# Altium footprint library PBL - SMD Packages.PcbLib: 218 footprints (part 14 of 14)
Each footprint in its own frame and in the unit in brackets; x right, y up, seen from the top. Pads: shape width x height; smd on the part's side, far side on the other; paste and mask are expansions set on the pad; w line width, h text height; cw(c..) or ccw(c..) is an arc to the next point about the centre after c.
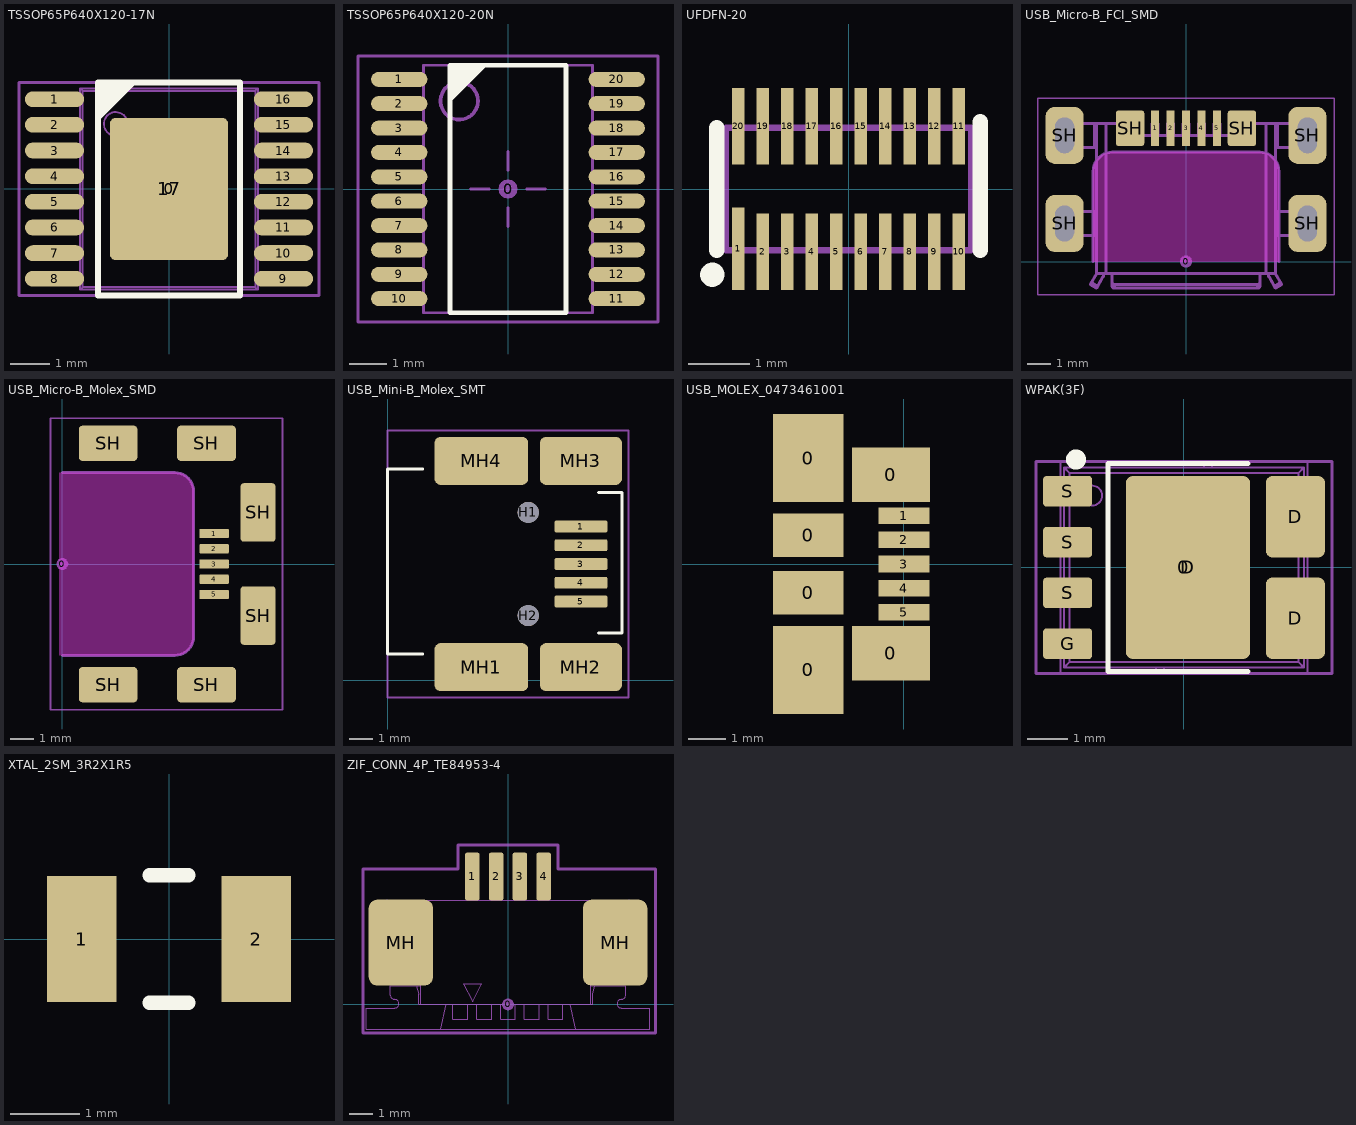
[diagram p13: the footprints below, top view; thin cyan lines are the x and y axes]

## TSSOP65P640X120-17N [mm] "TSSOP, 16 Leads with exposed body pad, Body 5.1x4.5mm (max), Pitch 0.65mm, IPC Medium Density"
height 1.2
pads (18):
  round 0.508 on Mech15: 0(0,0)
  oval 1.5x0.4 smd paste-0.051: 1(-2.9,2.275) 2(-2.9,1.625) 3(-2.9,0.975) 4(-2.9,0.325) 5(-2.9,-0.325) 6(-2.9,-0.975) 7(-2.9,-1.625) 8(-2.9,-2.275) 9(2.9,-2.275) 10(2.9,-1.625) 11(2.9,-0.975) 12(2.9,-0.325) 13(2.9,0.325) 14(2.9,0.975) 15(2.9,1.625) 16(2.9,2.275)
  rrect10% 3x3.6 smd paste-0.051: 17(0,0)
Top Overlay:
  region: -1.8,2.7 -0.8,2.7 -1.8,1.7
  lines w0.152: -1.8,-2.7 1.8,-2.7 1.8,2.7 -1.8,2.7 -1.8,-2.7
  text "." at -2.85,3 h0.1
Top Solder:
  region: 3.5,2.4 2.3,2.4 2.3,-2.4 3.5,-2.4
  rectangle: -3.5,-2.4 -2.3,2.4
13 - 3D Top Side:
  circle w0.05: c-1.35,1.65 r0.3
  lines w0.05: -2.839,-2.425 -2.839,-2.125 ; -2.839,-1.775 -2.839,-1.475 ; -2.839,-1.125 -2.839,-0.825 ; -2.839,-0.475 -2.839,-0.175 ; -2.839,0.175 -2.839,0.475 ; -2.839,0.825 -2.839,1.125 ; -2.839,1.475 -2.839,1.775 ; -2.839,2.125 -2.839,2.425 ; -2.795,-2.425 -2.795,-2.125 ; -2.795,-1.775 -2.795,-1.475 ; -2.795,-1.125 -2.795,-0.825 ; -2.795,-0.475 -2.795,-0.175 ; -2.795,0.175 -2.795,0.475 ; -2.795,0.825 -2.795,1.125 ; -2.795,1.475 -2.795,1.775 ; -2.795,2.125 -2.795,2.425 ; -2.693,-2.425 -2.693,-2.125 ; -2.693,-1.775 -2.693,-1.475 ; -2.693,-1.125 -2.693,-0.825 ; -2.693,-0.475 -2.693,-0.175 ; -2.693,0.175 -2.693,0.475 ; -2.693,0.825 -2.693,1.125 ; -2.693,1.475 -2.693,1.775 ; -2.693,2.125 -2.693,2.425 ; -2.5,-2.425 -2.5,-2.125 ; -2.5,-1.775 -2.5,-1.475 ; -2.5,-1.125 -2.5,-0.825 ; -2.5,-0.475 -2.5,-0.175 ; -2.5,0.175 -2.5,0.475 ; -2.5,0.825 -2.5,1.125 ; -2.5,1.475 -2.5,1.775 ; -2.5,2.125 -2.5,2.425 ; -2.25,-2.425 -3.25,-2.425 -3.25,-2.125 -2.25,-2.125 ; -2.25,-1.775 -3.25,-1.775 -3.25,-1.475 -2.25,-1.475 ; -2.25,-1.125 -3.25,-1.125 -3.25,-0.825 -2.25,-0.825 ; -2.25,-0.475 -3.25,-0.475 -3.25,-0.175 -2.25,-0.175 ; -2.25,0.175 -3.25,0.175 -3.25,0.475 -2.25,0.475 ; -2.25,0.825 -3.25,0.825 -3.25,1.125 -2.25,1.125 ; -2.25,1.475 -3.25,1.475 -3.25,1.775 -2.25,1.775 ; -2.25,2.125 -3.25,2.125 -3.25,2.425 -2.25,2.425 ; 2.25,-2.425 3.25,-2.425 3.25,-2.125 2.25,-2.125 ; 2.25,-1.775 3.25,-1.775 3.25,-1.475 2.25,-1.475 ; 2.25,-1.125 3.25,-1.125 3.25,-0.825 2.25,-0.825 ; 2.25,-0.475 3.25,-0.475 3.25,-0.175 2.25,-0.175 ; 2.25,0.175 3.25,0.175 3.25,0.475 2.25,0.475 ; 2.25,0.825 3.25,0.825 3.25,1.125 2.25,1.125 ; 2.25,1.475 3.25,1.475 3.25,1.775 2.25,1.775 ; 2.25,2.125 3.25,2.125 3.25,2.425 2.25,2.425 ; 2.5,-2.425 2.5,-2.125 ; 2.5,-1.775 2.5,-1.475 ; 2.5,-1.125 2.5,-0.825 ; 2.5,-0.475 2.5,-0.175 ; 2.5,0.175 2.5,0.475 ; 2.5,0.825 2.5,1.125 ; 2.5,1.475 2.5,1.775 ; 2.5,2.125 2.5,2.425 ; 2.693,-2.425 2.693,-2.125 ; 2.693,-1.775 2.693,-1.475 ; 2.693,-1.125 2.693,-0.825 ; 2.693,-0.475 2.693,-0.175 ; 2.693,0.175 2.693,0.475 ; 2.693,0.825 2.693,1.125 ; 2.693,1.475 2.693,1.775 ; 2.693,2.125 2.693,2.425 ; 2.795,-2.425 2.795,-2.125 ; 2.795,-1.775 2.795,-1.475 ; 2.795,-1.125 2.795,-0.825 ; 2.795,-0.475 2.795,-0.175 ; 2.795,0.175 2.795,0.475 ; 2.795,0.825 2.795,1.125 ; 2.795,1.475 2.795,1.775 ; 2.795,2.125 2.795,2.425 ; 2.839,-2.425 2.839,-2.125 ; 2.839,-1.775 2.839,-1.475 ; 2.839,-1.125 2.839,-0.825 ; 2.839,-0.475 2.839,-0.175 ; 2.839,0.175 2.839,0.475 ; 2.839,0.825 2.839,1.125 ; 2.839,1.475 2.839,1.775 ; 2.839,2.125 2.839,2.425 ; -2.25,-2.55 2.25,-2.55 ; -2.25,-2.55 -2.187,-2.487 ; -2.25,-2.55 -2.25,2.55 ; -2.25,2.55 -2.187,2.487 ; -2.25,2.55 2.25,2.55 ; -2.187,-2.487 2.187,-2.487 ; -2.187,-2.487 -2.187,2.487 ; -2.187,2.487 2.187,2.487 ; 2.187,-2.487 2.25,-2.55 ; 2.187,-2.487 2.187,2.487 ; 2.187,2.487 2.25,2.55 ; 2.25,-2.55 2.25,2.55
15 - Top Courtyards:
  lines w0.076: -3.8,-2.7 3.8,-2.7 3.8,2.7 -3.8,2.7 -3.8,-2.7
3D body "TSSOP65P640X120-16N.STEP": height 1.2, standoff 0, extent -3.25,-2.55 3.25,2.55

## TSSOP65P640X120-20N [mm] "TSSOP, 20-Leads, Body 6.6x4.5mm (max), Pitch 0.65mm, IPC Medium Density"
height 1.2
pads (21):
  round 0.508 on Mech15 mask+0.127: 0(0,0)
  oval 1.5x0.4 smd paste-1 mask+0.127: 1(-2.9,2.925) 2(-2.9,2.275) 3(-2.9,1.625) 4(-2.9,0.975) 5(-2.9,0.325) 6(-2.9,-0.325) 7(-2.9,-0.975) 8(-2.9,-1.625) 9(-2.9,-2.275) 10(-2.9,-2.925) 11(2.9,-2.925) 12(2.9,-2.275) 13(2.9,-1.625) 14(2.9,-0.975) 15(2.9,-0.325) 16(2.9,0.325) 17(2.9,0.975) 18(2.9,1.625) 19(2.9,2.275) 20(2.9,2.925)
Top Overlay:
  region: -1.55,3.3 -0.55,3.3 -1.55,2.3
  lines w0.127: -1.55,-3.3 -1.55,3.3 1.55,3.3 1.55,-3.3 -1.55,-3.3
  text "." at -2.85,3.7 h0.1
Top Paste:
  region: 3.5,-0.825 2.3,-0.825 2.3,-1.125 3.5,-1.125
  region: 3.5,-0.175 2.3,-0.175 2.3,-0.475 3.5,-0.475
  region: 3.5,0.475 2.3,0.475 2.3,0.175 3.5,0.175
  region: 3.5,1.125 2.3,1.125 2.3,0.825 3.5,0.825
  region: 3.5,1.775 2.3,1.775 2.3,1.475 3.5,1.475
  region: 3.5,2.425 2.3,2.425 2.3,2.125 3.5,2.125
  region: 3.5,3.075 2.3,3.075 2.3,2.775 3.5,2.775
  rectangle: -3.5,2.775 -2.3,3.075
  rectangle: -3.5,2.125 -2.3,2.425
  rectangle: -3.5,1.475 -2.3,1.775
  rectangle: -3.5,0.825 -2.3,1.125
  rectangle: -3.5,0.175 -2.3,0.475
  rectangle: -3.5,-0.475 -2.3,-0.175
  rectangle: -3.5,-1.125 -2.3,-0.825
  rectangle: -3.5,-3.075 -2.3,-2.775
  rectangle: -3.5,-2.425 -2.3,-2.125
  rectangle: -3.5,-1.775 -2.3,-1.475
  region: 3.5,-1.475 2.3,-1.475 2.3,-1.775 3.5,-1.775
  region: 3.5,-2.125 2.3,-2.125 2.3,-2.425 3.5,-2.425
  region: 3.5,-2.775 2.3,-2.775 2.3,-3.075 3.5,-3.075
13 - 3D Top Side:
  circle w0.1: c-1.3,2.35 r0.5
  lines w0.076: -2.25,-3.3 -2.25,3.3 2.25,3.3 2.25,-3.3 -2.25,-3.3
15 - Top Courtyards:
  lines w0.076: -1,0 -0.5,0 ; 0,-1 0,-0.5 ; 0,0.5 0,1 ; 0.5,0 1,0 ; -4,-3.55 -4,3.55 4,3.55 4,-3.55 -4,-3.55
3D body "TSSOP65P640X120-20N.STEP": height 1.2, standoff 0, extent -3.2,-3.25 3.2,3.25

## UFDFN-20 [mm]
height 0.5
pads (20):
  rect 0.2x1.35 smd: 1(-1.8,-0.975)
  rect 0.2x1.25 smd: 2(-1.4,-1.025) 3(-1,-1.025) 4(-0.6,-1.025) 5(-0.2,-1.025) 6(0.2,-1.025) 7(0.6,-1.025) 8(1,-1.025) 9(1.4,-1.025) 10(1.8,-1.025) 11(1.8,1.025) 12(1.4,1.025) 13(1,1.025) 14(0.6,1.025) 15(0.2,1.025) 16(-0.2,1.025) 17(-0.6,1.025) 18(-1,1.025) 19(-1.4,1.025) 20(-1.8,1.025)
Top Overlay:
  circle w0.254: c-2.225,-1.4 r0.071
  lines w0.25: -2.15,-1 -2.15,1 ; 2.15,-1 2.15,1.1
01 - Outline:
  lines w0.1: -2,-1 -2,1 2,1 2,-1 -2,-1
3D body: height 0.5, standoff 0, extent -1.999,-0.999 1.999,0.999

## USB_Micro-B_FCI_SMD [mm]
height 2.286
pads (12):
  round 0.508 on Mech15: 0(0,0)
  rrect20% 0.35x1.5 smd: 1(-1.3,5.6) 2(-0.65,5.6) 3(0,5.6) 4(0.65,5.6) 5(1.3,5.6)
  rrect50% 1.6x2.4 hole 0.8 slot 1.5 at 90 deg: SH(-5.1,1.6) SH(-5.1,5.3) SH(5.1,1.6) SH(5.1,5.3)
  rrect20% 1.2x1.5 smd: SH(-2.35,5.6) SH(2.35,5.6)
Top Solder:
  region: 1.905,4.826 1.905,6.35 -1.905,6.35 -1.905,4.826
Keep-Out Layer:
  board cut-out: -3.9,0 -3.9,3.797 -3.9,3.875 -3.869,4.03 -3.809,4.175 -3.721,4.307 -3.61,4.418 -3.479,4.505 -3.333,4.566 -3.179,4.597 -3.1,4.597 3.1,4.597 3.179,4.597 3.333,4.566 3.479,4.505 3.61,4.418 3.721,4.307 3.809,4.175 3.869,4.03 3.9,3.875 3.9,3.797 3.9,0
13 - 3D Top Side:
  lines w0.127: -4.85,1.1 -4.85,2.1 ; -4.85,4.8 -4.85,5.8 ; -3.97,-0.881 -3.71,-1.031 ; -3.85,1.1 -3.85,2.1 ; -3.85,4.8 -3.85,5.8 ; -3.75,1.1 -5.25,1.1 -5.25,2.1 -3.75,2.1 ; -3.75,4.8 -5.25,4.8 -5.25,5.8 -2.577,5.8 cw(c-2.577,5.6) -2.443,5.748 -2.007,5.352 ccw(c-1.873,5.5) -1.873,5.3 1.873,5.3 ccw(c1.873,5.5) 2.007,5.352 2.443,5.748 cw(c2.577,5.6) 2.577,5.8 5.25,5.8 5.25,4.8 3.75,4.8 ; -3.75,5.8 -3.75,-0.5 ; -3.45,-0.5 cw(c-3.75,-0.501) -3.49,-0.651 -3.76,-1.118 -4.02,-0.968 -3.75,-0.5 ; -3.35,-0.5 -3.35,5.8 ; -3.1,-0.881 ccw(c-3.006,-0.874) -3,-0.968 ; -2.526,5.793 -2.526,5.8 ; -2.229,5.553 ccw(c-2.275,5.8) -2.024,5.8 -1.825,5.8 -1.825,5.3 ; -1.425,5.3 -1.425,5.8 -1.175,5.8 -1.175,5.3 ; -0.775,5.3 -0.775,5.8 -0.525,5.8 -0.525,5.3 ; -0.125,5.3 -0.125,5.8 0.125,5.8 0.125,5.3 ; 0.525,5.3 0.525,5.8 0.775,5.8 0.775,5.3 ; 1.175,5.3 1.175,5.8 1.425,5.8 1.425,5.3 ; 1.825,5.3 1.825,5.8 2.024,5.8 ccw(c2.275,5.8) 2.229,5.553 ; 2.526,5.793 2.526,5.8 ; 3.1,-0.881 cw(c3.006,-0.874) 3,-0.968 ; 3.35,-0.5 3.35,5.8 ; 3.45,-0.5 ccw(c3.75,-0.501) 3.49,-0.651 3.76,-1.118 4.02,-0.968 3.75,-0.5 ; 3.71,-1.031 3.97,-0.881 ; 3.75,1.1 5.25,1.1 5.25,2.1 3.75,2.1 ; 3.75,5.8 3.75,-0.5 ; 3.85,1.1 3.85,2.1 ; 3.85,4.8 3.85,5.8 ; 4.85,1.1 4.85,2.1 ; 4.85,4.8 4.85,5.8 ; -3.75,-0.5 -3.1,-0.5 ; -3.1,-0.5 3.1,-0.501 ; -3.1,-0.5 -3.1,-1.031 ccw(c-3.006,-1.024) -3,-1.118 ; -3,-1.118 3,-1.118 ; -3,-1.118 -3,-0.968 ; -3,-0.968 3,-0.968 ; 3,-1.118 ccw(c3.006,-1.024) 3.1,-1.031 3.1,-0.5 ; 3,-1.118 3,-0.968 ; 3.1,-0.5 3.75,-0.5
15 - Top Courtyards:
  lines w0.076: -6.223,-1.397 -6.223,6.858 6.223,6.858 6.223,-1.397 -6.223,-1.397
  lines w0.127: -3.9,0 -3.9,3.797 cw(c-3.1,3.797) -3.1,4.597 3.1,4.597 cw(c3.1,3.797) 3.9,3.797 3.9,0
3D body "Micro USB B-type mid-mount FCI.STEP": height 2.15, standoff -0.92, extent -5.25,-1.118 5.25,5.8
3D body "USB Micro B plug.STEP": height 4.67, standoff -3.53, extent -5.35,-21.579 5.35,2.921

## USB_Micro-B_Molex_SMD [mm]
height 1.2
pads (12):
  round 0.508 on Mech15: 0(0,0)
  rrect20% 1.25x0.4 smd: 1(6.475,1.3) 2(6.475,0.65) 3(6.475,0) 4(6.475,-0.65) 5(6.475,-1.3)
  rrect20% 2.5x1.5 smd: SH(1.95,-5.15) SH(1.95,5.15) SH(6.15,-5.15) SH(6.15,5.15)
  rrect20% 1.5x2.5 smd: SH(8.35,-2.2) SH(8.35,2.2)
Top Solder:
  rectangle: 5.842,-1.27 7.112,1.27
Keep-Out Layer:
  board cut-out: -0.127,3.9 4.8,3.9 4.879,3.9 5.033,3.869 5.179,3.809 5.31,3.721 5.421,3.61 5.509,3.479 5.569,3.333 5.6,3.179 5.6,3.1 5.6,-3.1 5.6,-3.179 5.569,-3.333 5.509,-3.479 5.421,-3.61 5.31,-3.721 5.179,-3.809 5.033,-3.869 4.879,-3.9 4.8,-3.9 -0.127,-3.9
13 - 3D Top Side:
  lines w0.127: 0,-3.9 4.8,-3.9 ccw(c4.8,-3.1) 5.6,-3.1 5.6,3.1 ccw(c4.8,3.1) 4.8,3.9 0,3.9
15 - Top Courtyards:
  lines w0.076: -0.5,-6.223 9.398,-6.223 9.398,6.223 -0.5,6.223 -0.5,-6.223
3D body "Micro USB B Receptacle Middle Mount.STEP": height 1.43, standoff -1.52, extent -0.43,-5.5 8.7,5.5
3D body "USB Micro B plug.STEP": height 4.1, standoff -4.1, extent -21.007,-5.35 3.492,5.35

## USB_Mini-B_Molex_SMT [mm]
height 3.95
pads (11):
  rrect25% 2.25x0.5 smd: 1(8.25,6.55) 2(8.25,5.75) 3(8.25,4.95) 4(8.25,4.15) 5(8.25,3.35)
  round 0.9 hole 0.9 unplated: H1(6,7.15) H2(6,2.75)
  rrect25% 4x2.05 smd: MH1(4,0.55) MH4(4,9.35)
  rrect25% 3.5x2.05 smd: MH2(8.25,0.55) MH3(8.25,9.35)
Top Overlay:
  lines w0.127: 1.5,1.1 0,1.1 0,9 1.5,9 ; 9,2 10,2 10,8 9,8
15 - Top Courtyards:
  lines w0.076: 0,-0.75 0,10.65 10.275,10.65 10.275,-0.75 0,-0.75
3D body: height 3.95, standoff 0, extent 0,1.1 9,9

## USB_MOLEX_0473461001 [mm]
height 2.45
pads (11):
  rect 1.9x2.375 smd: 0(-2.575,-2.85) 0(-2.575,2.85)
  rect 1.9x1.175 smd: 0(-2.575,-0.775) 0(-2.575,0.775)
  rect 2.1x1.475 smd: 0(-0.35,-2.4) 0(-0.35,2.4)
  rect 1.38x0.45 smd: 1(0,1.3) 2(0,0.65) 3(0,0) 4(0,-0.65) 5(0,-1.3)
Top Solder:
  rectangle: -3.625,1.275 -1.525,1.75
  rectangle: -3.6,1.55 -0.775,3.25
  rectangle: -3.625,-0.1 -1.525,0.375
  rectangle: -3.65,-1.95 -1.525,-1.325
  rectangle: -3.65,-3.25 -0.775,-1.55
3D body "473461001.STEP": height 2.68, standoff -0.03, extent -4.7,-3.9 0.3,3.9

## WPAK(3F) [mm] "Footprint similar to SOIC-8, Body 5.1x6.1mm, Pitch 1.27mm, IPC Medium Density"
height 0.85
pads (8):
  round 1 on Mech15: 0(0,0)
  rrect10% 3.1x4.57 smd: D(0.1,0)
  rrect20% 1.47x2.03 smd: D(2.785,-1.27) D(2.785,1.27)
  rrect20% 1.22x0.76 smd: G(-2.91,-1.905) S(-2.91,-0.635) S(-2.91,0.635) S(-2.91,1.905)
Top Overlay:
  circle w0.25: c-2.7,2.7 r0.125
  lines w0.127: 1.6,-2.6 -1.9,-2.6 -1.9,2.6 1.6,2.6
13 - 3D Top Side:
  circle w0.05: c-2.298,1.798 r0.25
  lines w0.05: -3.09,-2.115 -3.09,-2.64 -0.7,-2.64 ; -3.09,-1.695 -3.09,-0.845 ; -3.09,-0.425 -3.09,0.425 ; -3.09,0.845 -3.09,1.695 ; -3.09,2.115 -3.09,2.64 0.5,2.64 ; -3,-2.115 -3,-2.5 ; -3,-1.695 -3,-0.845 ; -3,-0.425 -3,0.425 ; -3,0.845 -3,1.695 ; -3,2.115 -3,2.5 ; -0.7,-2.5 -3,-2.5 ; -0.5,-2.64 3.09,-2.64 3.09,-2.115 ; -0.5,-2.5 3,-2.5 ; 0.5,2.5 -3,2.5 ; 0.7,2.5 3,2.5 ; 0.7,2.64 3.09,2.64 3.09,2.115 ; 3,-2.115 3,-2.5 ; 3,-1.695 3,-0.845 ; 3,-0.425 3,0.425 ; 3,0.845 3,1.695 ; 3,2.115 3,2.5 ; 3.09,-1.695 3.09,-0.845 ; 3.09,-0.425 3.09,0.425 ; 3.09,0.845 3.09,1.695 ; -3,-2.5 -2.864,-2.364 ; -3,2.5 -2.864,2.364 ; -2.864,-2.364 -2.864,2.364 ; -2.864,-2.364 2.864,-2.364 ; -2.864,2.364 2.864,2.364 ; 2.864,-2.364 3,-2.5 ; 2.864,-2.364 2.864,2.364 ; 2.864,2.364 3,2.5 ; -3.1,-2.115 -3.1,-1.695 -2.998,-1.695 -2.998,-2.115 -3.1,-2.115 ; -3.1,-0.845 -3.1,-0.425 -2.998,-0.425 -2.998,-0.845 -3.1,-0.845 ; -3.1,0.425 -3.1,0.845 -2.998,0.845 -2.998,0.425 -3.1,0.425 ; -3.1,1.695 -3.1,2.115 -2.998,2.115 -2.998,1.695 -3.1,1.695 ; -0.7,-2.65 -0.5,-2.65 -0.5,-2.498 -0.7,-2.498 -0.7,-2.65 ; 0.5,2.498 0.7,2.498 0.7,2.65 0.5,2.65 0.5,2.498 ; 2.998,-2.115 2.998,-1.695 3.1,-1.695 3.1,-2.115 2.998,-2.115 ; 2.998,-0.845 2.998,-0.425 3.1,-0.425 3.1,-0.845 2.998,-0.845 ; 2.998,0.425 2.998,0.845 3.1,0.845 3.1,0.425 2.998,0.425 ; 2.998,1.695 2.998,2.115 3.1,2.115 3.1,1.695 2.998,1.695
15 - Top Courtyards:
  lines w0.076: -3.7,-2.65 -3.7,2.65 3.7,2.65 3.7,-2.65 -3.7,-2.65
3D body "WPAK(3F).STEP": height 0.85, standoff 0, extent -3.1,-2.65 3.1,2.65

## XTAL_2SM_3R2X1R5 [mm] "CRYSTAL 32.768KHZ 6PF SMD 2 pads"
height 1.1
pads (2):
  rect 1x1.8 smd: 1(-1.25,0) 2(1.25,0)
Top Overlay:
  lines w0.203: -0.279,-0.914 0.279,-0.914 ; -0.279,0.914 0.279,0.914
3D body "ABS07-120.STEP": height 0.89, standoff 0, extent -1.628,-0.752 1.577,0.752

## ZIF_CONN_4P_TE84953-4 [mm] "TE Connectivity 4-pin ZIF connector"
height 2.74
pads (7):
  round 0.5 on Mech15: 0(0,0)
  rrect25% 0.61x2 smd: 1(-1.5,5.375) 2(-0.5,5.375) 3(0.5,5.375) 4(1.5,5.375)
  rrect25% 2.7x3.6 smd: MH(-4.5,2.6) MH(4.5,2.6)
13 - 3D Top Side:
  lines w0.05: -4.56,3.1 -3.93,3.1 ; -4.56,4.37 -4.56,0.87 -3.67,0.87 -3.67,0 ; -4.28,4.37 -4.18,3.997 -4.18,3.1 ; -4.18,0.86 -4.18,0.87 ; -3.982,0.87 -3.982,0.86 -5.072,0.86 cw(c-5.072,0.96) -5.172,0.96 -5.172,1.261 cw(c-5.072,1.261) -5.072,1.361 -4.762,1.361 ccw(c-4.762,1.461) -4.662,1.461 -4.662,1.763 ccw(c-4.762,1.763) -4.762,1.863 -5.072,1.863 cw(c-5.072,1.963) -5.172,1.963 -5.172,2.264 cw(c-5.072,2.264) -5.072,2.364 -4.762,2.364 ccw(c-4.762,2.464) -4.662,2.464 -4.662,2.766 ccw(c-4.762,2.766) -4.762,2.866 -5.072,2.866 cw(c-5.072,2.966) -5.172,2.966 -5.172,3.267 cw(c-5.072,3.267) -5.072,3.367 -4.762,3.367 ccw(c-4.762,3.467) -4.662,3.467 -4.662,3.769 ccw(c-4.762,3.769) -4.762,3.869 -5.072,3.869 cw(c-5.072,3.969) -5.172,3.969 -5.172,4.27 cw(c-5.072,4.27) -5.072,4.37 5.072,4.37 cw(c5.072,4.27) 5.172,4.27 5.172,3.969 cw(c5.072,3.969) 5.072,3.869 4.762,3.869 ccw(c4.762,3.769) 4.662,3.769 4.662,3.467 ccw(c4.762,3.467) 4.762,3.367 5.072,3.367 cw(c5.072,3.267) 5.172,3.267 5.172,2.966 cw(c5.072,2.966) 5.072,2.866 4.762,2.866 ccw(c4.762,2.766) 4.662,2.766 4.662,2.464 ccw(c4.762,2.464) 4.762,2.364 5.072,2.364 cw(c5.072,2.264) 5.172,2.264 5.172,1.963 cw(c5.072,1.963) 5.072,1.863 4.762,1.863 ccw(c4.762,1.763) 4.662,1.763 4.662,1.461 ccw(c4.762,1.461) 4.762,1.361 5.072,1.361 cw(c5.072,1.261) 5.172,1.261 5.172,0.96 cw(c5.072,0.96) 5.072,0.86 4.232,0.86 4.229,0.87 ; -3.93,0.87 -3.93,3.997 -3.83,4.37 ; -3.846,0.79 -3.75,0.43 -3.75,0 3.55,0 3.55,0.43 3.646,0.79 ; -3.67,0.79 -4.94,0.79 -4.94,0.39 ccw(c-4.76,0.39) -4.76,0.21 cw(c-4.76,0.03) -4.76,-0.15 -5.96,-0.15 -5.96,-1.04 5.96,-1.04 5.96,-0.15 4.76,-0.15 cw(c4.76,0.03) 4.76,0.21 ccw(c4.76,0.39) 4.94,0.39 4.94,0.79 3.47,0.79 ; -2.82,-1.04 -2.59,0 ; -2.311,0 -2.311,-0.63 -1.691,-0.63 -1.691,0 ; -1.596,4.37 -1.596,5.51 -1.396,5.51 -1.396,4.37 ; -1.596,4.88 -1.396,4.88 ; -1.596,5.01 -1.396,5.01 ; -1.596,5.38 -1.396,5.38 ; -1.311,0 -1.311,-0.63 -0.691,-0.63 -0.691,0 ; -0.596,4.37 -0.596,5.51 -0.396,5.51 -0.396,4.37 ; -0.596,4.88 -0.396,4.88 ; -0.596,5.01 -0.396,5.01 ; -0.596,5.38 -0.396,5.38 ; -0.31,0 -0.31,-0.63 0.309,-0.63 0.309,0 ; 0.405,4.37 0.405,5.51 0.604,5.51 0.604,4.37 ; 0.405,4.88 0.604,4.88 ; 0.405,5.01 0.604,5.01 ; 0.405,5.38 0.604,5.38 ; 0.69,0 0.69,-0.63 1.309,-0.63 1.309,0 ; 1.405,4.37 1.405,5.51 1.605,5.51 1.605,4.37 ; 1.405,4.88 1.605,4.88 ; 1.405,5.01 1.605,5.01 ; 1.405,5.38 1.605,5.38 ; 1.69,0 1.69,-0.63 2.31,-0.63 2.31,0 ; 2.59,0 2.82,-1.04 ; 3.47,0 3.47,0.87 4.56,0.87 4.56,4.37 ; 3.83,0.87 3.93,1.243 3.93,4.37 ; 3.93,2.14 4.18,2.14 4.18,1.243 4.28,0.87 ; 4.18,1.92 4.56,1.92 ; -1.871,0.87 -1.111,0.87 -1.49,0.11 -1.871,0.87
15 - Top Courtyards:
  lines w0.127: -6.1,-1.2 -6.1,5.7 -2.1,5.7 -2.1,6.7 2.1,6.7 2.1,5.7 6.2,5.7 6.2,-1.2 -6.1,-1.2
3D body "ZIF Conn TE 84953-4.STEP": height 2.58, standoff 0, extent -5.96,-1.04 5.96,5.51